# Altium footprint library MyComponents_v2.5.PcbLib: 403 footprints (part 13 of 26)
Each footprint in its own frame and in the unit in brackets; x right, y up, seen from the top. Pads: shape width x height; smd on the part's side, far side on the other; paste and mask are expansions set on the pad; w line width, h text height; cw(c..) or ccw(c..) is an arc to the next point about the centre after c.
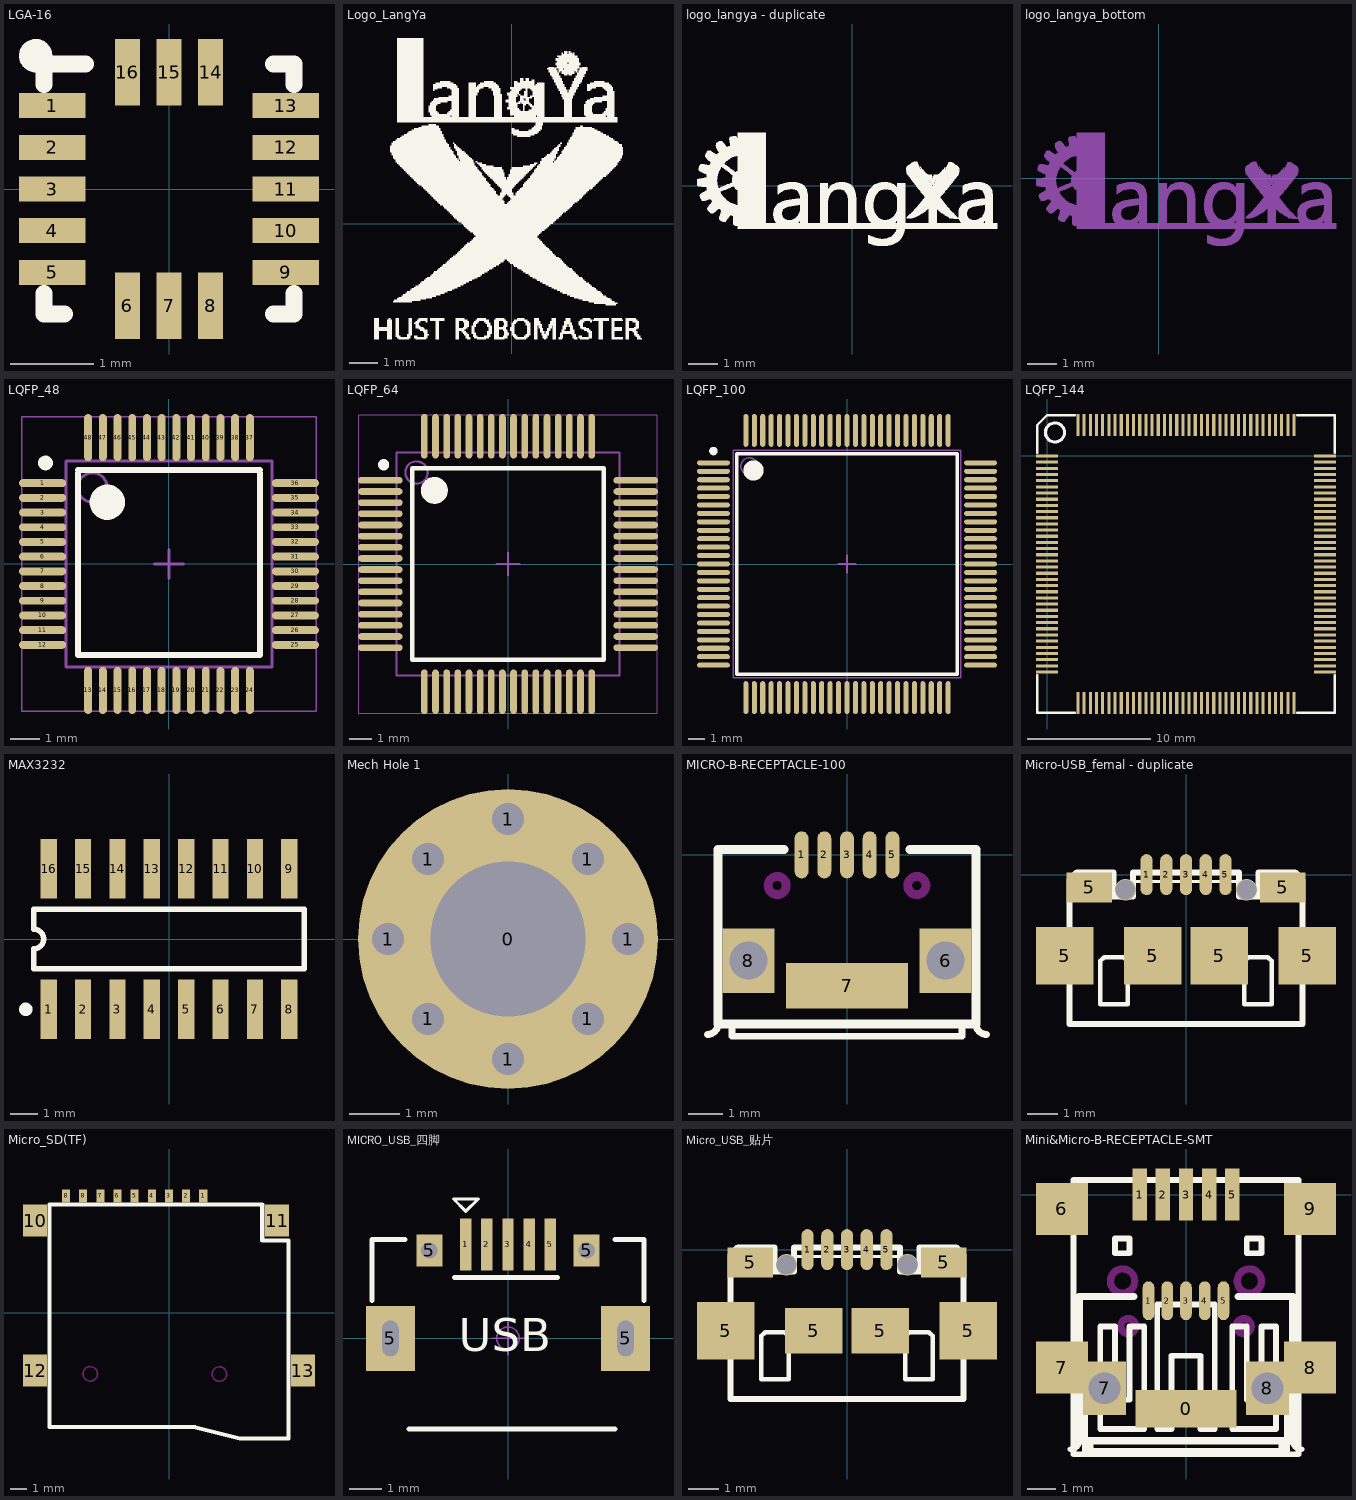
[diagram p12: the footprints below, top view; thin cyan lines are the x and y axes]

## LGA-16 [mm]
pads (16):
  rect 0.8x0.3 smd: 1(-1.4,1) 2(-1.4,0.5) 3(-1.4,0) 4(-1.4,-0.5) 5(-1.4,-1) 9(1.4,-1) 10(1.4,-0.5) 11(1.4,0) 12(1.4,0.5) 13(1.4,1)
  rect 0.3x0.8 smd: 6(-0.5,-1.4) 7(0,-1.4) 8(0.5,-1.4) 14(0.5,1.4) 15(0,1.4) 16(-0.5,1.4)
Top Overlay:
  circle w0.2: c-1.6,1.6 r0.1
  lines w0.2: -1.5,-1.25 -1.5,-1.5 ; -1.5,1.25 -1.5,1.5 -1,1.5 ; -1.25,-1.5 -1.5,-1.5 ; 1.25,-1.5 1.5,-1.5 ; 1.25,1.5 1.5,1.5 1.5,1.25 ; 1.5,-1.25 1.5,-1.5 ; -1.5,-1.5 -1.5,-1.5 ; 1.5,-1.5 1.5,-1.5
3D body "LGA16.step": height 1.01, standoff -0.01, extent -1.5,-1.5 1.5,1.5

## Logo_LangYa [mm]
Top Overlay:
  drawing of 953 lines, arcs and shapes, not listed

## logo_langya - duplicate [mm]
Top Overlay:
  drawing of 1377 lines, arcs and shapes, not listed

## logo_langya_bottom [mm]
Bottom Overlay:
  drawing of 1377 lines, arcs and shapes, not listed

## LQFP_48 [mm] "TSQFP, 48-Leads, Body 7.00x7.00mm, Pitch 0.50mm, IPC Medium Density"
height 1.6
pads (48):
  oval 1.6x0.27 smd: 1(-4.3,2.75) 2(-4.3,2.25) 3(-4.3,1.75) 4(-4.3,1.25) 5(-4.3,0.75) 6(-4.3,0.25) 7(-4.3,-0.25) 8(-4.3,-0.75) 9(-4.3,-1.25) 10(-4.3,-1.75) 11(-4.3,-2.25) 12(-4.3,-2.75) 25(4.3,-2.75) 26(4.3,-2.25) 27(4.3,-1.75) 28(4.3,-1.25) 29(4.3,-0.75) 30(4.3,-0.25) 31(4.3,0.25) 32(4.3,0.75) 33(4.3,1.25) 34(4.3,1.75) 35(4.3,2.25) 36(4.3,2.75)
  oval 0.27x1.6 smd: 13(-2.75,-4.3) 14(-2.25,-4.3) 15(-1.75,-4.3) 16(-1.25,-4.3) 17(-0.75,-4.3) 18(-0.25,-4.3) 19(0.25,-4.3) 20(0.75,-4.3) 21(1.25,-4.3) 22(1.75,-4.3) 23(2.25,-4.3) 24(2.75,-4.3) 37(2.75,4.3) 38(2.25,4.3) 39(1.75,4.3) 40(1.25,4.3) 41(0.75,4.3) 42(0.25,4.3) 43(-0.25,4.3) 44(-0.75,4.3) 45(-1.25,4.3) 46(-1.75,4.3) 47(-2.25,4.3) 48(-2.75,4.3)
Top Overlay:
  circle w0.25: c-4.2,3.435 r0.125
  circle w0.6: c-2.1,2.1 r0.3
  lines w0.2: -3.1,3.1 -3.1,-3.1 3.1,-3.1 3.1,3.1 ; -3.1,3.2 3.1,3.2
Mechanical 13:
  circle w0.1: c-2.6,2.6 r0.5
  lines w0.1: -3.5,-3.5 -3.5,3.5 3.5,3.5 3.5,-3.5 -3.5,-3.5
Mechanical 15:
  lines w0.05: -5,-5 -5,5 5,5 5,-5 -5,-5
  lines w0.1: -0.5,0 0.5,0 ; 0,-0.5 0,0.5
3D body "User Library-LQFP48.step": height 1.5, standoff 0, extent -4.5,-4.5 4.5,4.5

## LQFP_64 [mm]
pads (64):
  oval 2x0.3 smd: 1(-5.725,3.75) 2(-5.725,3.25) 3(-5.725,2.75) 4(-5.725,2.25) 5(-5.725,1.75) 6(-5.725,1.25) 7(-5.725,0.75) 8(-5.725,0.25) 9(-5.725,-0.25) 10(-5.725,-0.75) 11(-5.725,-1.25) 12(-5.725,-1.75) 13(-5.725,-2.25) 14(-5.725,-2.75) 15(-5.725,-3.25) 16(-5.725,-3.75) 33(5.725,-3.75) 34(5.725,-3.25) 35(5.725,-2.75) 36(5.725,-2.25) 37(5.725,-1.75) 38(5.725,-1.25) 39(5.725,-0.75) 40(5.725,-0.25) 41(5.725,0.25) 42(5.725,0.75) 43(5.725,1.25) 44(5.725,1.75) 45(5.725,2.25) 46(5.725,2.75) 47(5.725,3.25) 48(5.725,3.75)
  oval 0.3x2 smd: 17(-3.75,-5.725) 18(-3.25,-5.725) 19(-2.75,-5.725) 20(-2.25,-5.725) 21(-1.75,-5.725) 22(-1.25,-5.725) 23(-0.75,-5.725) 24(-0.25,-5.725) 25(0.25,-5.725) 26(0.75,-5.725) 27(1.25,-5.725) 28(1.75,-5.725) 29(2.25,-5.725) 30(2.75,-5.725) 31(3.25,-5.725) 32(3.75,-5.725) 49(3.75,5.725) 50(3.25,5.725) 51(2.75,5.725) 52(2.25,5.725) 53(1.75,5.725) 54(1.25,5.725) 55(0.75,5.725) 56(0.25,5.725) 57(-0.25,5.725) 58(-0.75,5.725) 59(-1.25,5.725) 60(-1.75,5.725) 61(-2.25,5.725) 62(-2.75,5.725) 63(-3.25,5.725) 64(-3.75,5.725)
Top Overlay:
  circle w0.25: c-5.575,4.45 r0.125
  circle w0.6: c-3.3,3.3 r0.3
  lines w0.2: -4.3,-4.3 -4.3,4.3 4.3,4.3 4.3,-4.3 -4.3,-4.3
Mechanical 13:
  circle w0.1: c-4.1,4.1 r0.5
  lines w0.1: -5,-5 -5,5 5,5 5,-5 -5,-5
Mechanical 15:
  lines w0.05: -6.7,-6.7 -6.7,6.7 6.7,6.7 6.7,-6.7 -6.7,-6.7
  lines w0.1: -0.5,0 0.5,0 ; 0,-0.5 0,0.5
3D body "LQFP64-2.STEP": height 1.62, standoff -0.01, extent -6.072,-6.072 6.072,6.072

## LQFP_100 [mm] "K60P100M-FINAL"
height 2.45
pads (100):
  oval 1.95x0.3 smd: 1(-7.925,6) 2(-7.925,5.5) 3(-7.925,5) 4(-7.925,4.5) 5(-7.925,4) 6(-7.925,3.5) 7(-7.925,3) 8(-7.925,2.5) 9(-7.925,2) 10(-7.925,1.5) 11(-7.925,1) 12(-7.925,0.5) 13(-7.925,0) 14(-7.925,-0.5) 15(-7.925,-1) 16(-7.925,-1.5) 17(-7.925,-2) 18(-7.925,-2.5) 19(-7.925,-3) 20(-7.925,-3.5) 21(-7.925,-4) 22(-7.925,-4.5) 23(-7.925,-5) 24(-7.925,-5.5) 25(-7.925,-6) 51(7.925,-6) 52(7.925,-5.5) 53(7.925,-5) 54(7.925,-4.5) 55(7.925,-4) 56(7.925,-3.5) 57(7.925,-3) 58(7.925,-2.5) 59(7.925,-2) 60(7.925,-1.5) 61(7.925,-1) 62(7.925,-0.5) 63(7.925,0) 64(7.925,0.5) 65(7.925,1) 66(7.925,1.5) 67(7.925,2) 68(7.925,2.5) 69(7.925,3) 70(7.925,3.5) 71(7.925,4) 72(7.925,4.5) 73(7.925,5) 74(7.925,5.5) 75(7.925,6)
  oval 0.3x1.95 smd: 26(-6,-7.925) 27(-5.5,-7.925) 28(-5,-7.925) 29(-4.5,-7.925) 30(-4,-7.925) 31(-3.5,-7.925) 32(-3,-7.925) 33(-2.5,-7.925) 34(-2,-7.925) 35(-1.5,-7.925) 36(-1,-7.925) 37(-0.5,-7.925) 38(0,-7.925) 39(0.5,-7.925) 40(1,-7.925) 41(1.5,-7.925) 42(2,-7.925) 43(2.5,-7.925) 44(3,-7.925) 45(3.5,-7.925) 46(4,-7.925) 47(4.5,-7.925) 48(5,-7.925) 49(5.5,-7.925) 50(6,-7.925) 76(6,7.925) 77(5.5,7.925) 78(5,7.925) 79(4.5,7.925) 80(4,7.925) 81(3.5,7.925) 82(3,7.925) 83(2.5,7.925) 84(2,7.925) 85(1.5,7.925) 86(1,7.925) 87(0.5,7.925) 88(0,7.925) 89(-0.5,7.925) 90(-1,7.925) 91(-1.5,7.925) 92(-2,7.925) 93(-2.5,7.925) 94(-3,7.925) 95(-3.5,7.925) 96(-4,7.925) 97(-4.5,7.925) 98(-5,7.925) 99(-5.5,7.925) 100(-6,7.925)
Top Overlay:
  circle w0.6: c-5.55,5.55 r0.3
  circle w0.25: c-7.925,6.7 r0.125
  lines w0.2: -6.55,-6.55 -6.55,0.711 -6.55,6.55 6.55,6.55 6.55,-6.55 -6.55,-6.55
Mechanical 13:
  circle w0.1: c-5.8,5.8 r0.5
  lines w0.1: -6.75,-6.75 6.75,-6.75 6.75,6.75 -6.75,6.75 -6.75,-6.75
Mechanical 15:
  lines w0.1: -0.5,0 0.5,0 ; 0,-0.5 0,0.5
3D body "User Library-LQFP100_Grid_0_5.STEP": height 1.6, standoff 0, extent -8.025,-8 7.975,8

## LQFP_144 [mm]
pads (144):
  rect 1.8x0.254 smd: 1(-0.009,0.001) 2(-0.009,-0.499) 3(-0.009,-0.999) 4(-0.009,-1.499) 5(-0.009,-1.999) 6(-0.009,-2.499) 7(-0.009,-2.999) 8(-0.009,-3.499) 9(-0.009,-3.999) 10(-0.009,-4.499) 11(-0.009,-4.999) 12(-0.009,-5.499) 13(-0.009,-5.999) 14(-0.009,-6.499) 15(-0.009,-6.999) 16(-0.009,-7.499) 17(-0.009,-7.999) 18(-0.009,-8.499) 19(-0.009,-8.999) 20(-0.009,-9.499) 21(-0.009,-9.999) 22(-0.009,-10.499) 23(-0.009,-10.999) 24(-0.009,-11.499) 25(-0.009,-11.999) 26(-0.009,-12.499) 27(-0.009,-12.999) 28(-0.009,-13.499) 29(-0.009,-13.999) 30(-0.009,-14.499) 31(-0.009,-14.999) 32(-0.009,-15.499) 33(-0.009,-15.999) 34(-0.009,-16.499) 35(-0.009,-16.999) 36(-0.009,-17.499) 73(22.491,-17.499) 74(22.491,-16.999) 75(22.491,-16.499) 76(22.491,-15.999) 77(22.491,-15.499) 78(22.491,-14.999) 79(22.491,-14.499) 80(22.491,-13.999) 81(22.491,-13.499) 82(22.491,-12.999) 83(22.491,-12.499) 84(22.491,-11.999) 85(22.491,-11.499) 86(22.491,-10.999) 87(22.491,-10.499) 88(22.491,-9.999) 89(22.491,-9.499) 90(22.491,-8.999) 91(22.491,-8.499) 92(22.491,-7.999) 93(22.491,-7.499) 94(22.491,-6.999) 95(22.491,-6.499) 96(22.491,-5.999) 97(22.491,-5.499) 98(22.491,-4.999) 99(22.491,-4.499) 100(22.491,-3.999) 101(22.491,-3.499) 102(22.491,-2.999) 103(22.491,-2.499) 104(22.491,-1.999) 105(22.491,-1.499) 106(22.491,-0.999) 107(22.491,-0.499) 108(22.491,0.001)
  rect 0.254x1.8 smd: 37(2.491,-19.999) 38(2.991,-19.999) 39(3.491,-19.999) 40(3.991,-19.999) 41(4.491,-19.999) 42(4.991,-19.999) 43(5.491,-19.999) 44(5.991,-19.999) 45(6.491,-19.999) 46(6.991,-19.999) 47(7.491,-19.999) 48(7.991,-19.999) 49(8.491,-19.999) 50(8.991,-19.999) 51(9.491,-19.999) 52(9.991,-19.999) 53(10.491,-19.999) 54(10.991,-19.999) 55(11.491,-19.999) 56(11.991,-19.999) 57(12.491,-19.999) 58(12.991,-19.999) 59(13.491,-19.999) 60(13.991,-19.999) 61(14.491,-19.999) 62(14.991,-19.999) 63(15.491,-19.999) 64(15.991,-19.999) 65(16.491,-19.999) 66(16.991,-19.999) 67(17.491,-19.999) 68(17.991,-19.999) 69(18.491,-19.999) 70(18.991,-19.999) 71(19.491,-19.999) 72(19.991,-19.999) 109(19.991,2.501) 110(19.491,2.501) 111(18.991,2.501) 112(18.491,2.501) 113(17.991,2.501) 114(17.491,2.501) 115(16.991,2.501) 116(16.491,2.501) 117(15.991,2.501) 118(15.491,2.501) 119(14.991,2.501) 120(14.491,2.501) 121(13.991,2.501) 122(13.491,2.501) 123(12.991,2.501) 124(12.491,2.501) 125(11.991,2.501) 126(11.491,2.501) 127(10.991,2.501) 128(10.491,2.501) 129(9.991,2.501) 130(9.491,2.501) 131(8.991,2.501) 132(8.491,2.501) 133(7.991,2.501) 134(7.491,2.501) 135(6.991,2.501) 136(6.491,2.501) 137(5.991,2.501) 138(5.491,2.501) 139(4.991,2.501) 140(4.491,2.501) 141(3.991,2.501) 142(3.491,2.501) 143(2.991,2.501) 144(2.491,2.501)
Top Overlay:
  circle w0.254: c0.624,1.905 r0.773
  lines w0.2: -0.809,-17.749 -0.809,-20.799 2.241,-20.799 ; -0.809,0.251 -0.809,2.501 -0.009,3.301 2.241,3.301 ; 20.241,-20.799 23.291,-20.799 23.291,-17.749 ; 20.241,3.301 23.291,3.301 23.291,0.251

## MAX3232 [mm]
pads (16):
  rect 0.6x2.2 smd: 1(-4.445,-2.6) 2(-3.175,-2.6) 3(-1.905,-2.6) 4(-0.635,-2.6) 5(0.635,-2.6) 6(1.905,-2.6) 7(3.175,-2.6) 8(4.445,-2.6) 9(4.445,2.6) 10(3.175,2.6) 11(1.905,2.6) 12(0.635,2.6) 13(-0.635,2.6) 14(-1.905,2.6) 15(-3.175,2.6) 16(-4.445,2.6)
Top Overlay:
  circle w0.25: c-5.295,-2.6 r0.125
  lines w0.2: -5,-1.1 5,-1.1 5,1.1 -5,1.1 -5,0.367 cw(c-5,0) -5,-0.367 -5,-1.1

## Mech Hole 1 [mm] "3.1mm"
pads (9):
  round 6 hole 3.1: 0(0,0)
  round 0.635 hole 0.635: 1(-2.4,0) 1(-1.6,-1.6) 1(-1.6,1.6) 1(0,-2.4) 1(0,2.4) 1(1.6,-1.6) 1(1.6,1.6) 1(2.4,0)
3D body "User Library-M3x0_5xL Phillips Panhead Screw.STEP": height 2.38, standoff -6, extent -2.8,-2.8 2.8,2.8

## MICRO-B-RECEPTACLE-100 [mm]
pads (8):
  oval 0.4x1.35 smd: 1(-1.3,0) 2(-0.65,0) 3(0,0) 4(0.65,0) 5(1.3,0)
  rect 1.5x1.85 hole 1.1: 6(2.825,-3.03) 8(-2.825,-3.03)
  rect 3.5x1.3 smd: 7(0,-3.75)
Top Overlay:
  lines w0.2: -4,-5.15 ccw(c-4,-4.85) -3.7,-4.85 ; -3.3,-4.85 -3.3,-5.2 3.3,-5.2 3.3,-4.85 ; 3.7,-4.85 ccw(c4,-4.85) 4,-5.15
  lines w0.254: -1.8,0.15 -3.7,0.15 -3.7,-4.85 3.7,-4.85 3.7,0.15 1.8,0.15
Bottom Overlay:
  lines w0.254: -4.1,-4.65 4.1,-4.65 ; -4.1,-5.25 4.1,-5.25 4.1,0.15 -4.1,0.15 -4.1,-5.25
Keep-Out Layer:
  circle w0.254: c-2,-0.88 r0.26
  circle w0.254: c2,-0.88 r0.26

## Micro-USB_femal - duplicate [mm]
pads (11):
  oval 0.4x1.35 smd: 1(-1.3,0) 2(-0.65,0) 3(0,0) 4(0.65,0) 5(1.3,0)
  rect 1.9x1.9 smd: 5(-4,-2.675) 5(-1.1,-2.675) 5(1.1,-2.675) 5(4,-2.675)
  rect 1.5x1 smd: 5(-3.2,-0.425) 5(3.2,-0.425)
via -2,-0.5 diameter 0.7 hole 0.65
via 2,-0.5 diameter 0.7 hole 0.65
Top Overlay:
  lines w0.1: -1.75,-0.225 1.75,-0.225
  lines w0.15: -2.825,-4.275 -1.925,-4.275 -1.925,-2.85 -2.05,-2.725 -2.7,-2.725 -2.825,-2.85 -2.825,-4.275 ; 1.925,-4.275 1.925,-2.85 2.05,-2.725 2.7,-2.725 2.825,-2.85 2.825,-4.275 1.925,-4.275
  lines w0.2: -3.85,-4.925 3.85,-4.925 3.85,-0.175 3.6,0.075 2.4,0.075 2.4,-0.725 1.75,-0.725 1.75,0.075 -1.75,0.075 -1.75,-0.725 -2.4,-0.725 -2.4,0.075 -3.6,0.075 -3.85,-0.175 -3.85,-4.925
3D body "microUSB.stp": height 2.71, standoff -0.23, extent -4.4,-5.381 4.4,0.35

## Micro_SD(TF) [mm] "TF Card"
height 0.6
pads (13):
  rect 0.5x0.8 smd: 1(2.108,7.236) 2(1.046,7.236) 3(-0.017,7.236) 4(-1.079,7.236) 5(-2.142,7.236) 6(-3.204,7.236) 7(-4.267,7.236) 8(-6.392,7.236) 8(-5.329,7.236)
  rect 1.5x2 smd: 10(-8.306,5.712) 11(6.68,5.712) 12(-8.306,-3.583) 13(8.28,-3.583)
Top Overlay:
  lines w0.254: 1.524,-7.083 4.368,-7.794 ; 1.591,-7.091 -7.409,-7.091 -7.409,6.709 5.765,6.709 5.765,4.468 7.391,4.468 7.391,-7.791 4.391,-7.791
Keep-Out Layer:
  circle w0.1: c-4.892,-3.787 r0.45
  circle w0.1: c3.108,-3.801 r0.45

## MICRO_USB_四脚 [mm] "micro型USB ，5.7*7.8*2.5mm"
pads (9):
  rect 0.35x1.6 smd: 1(-1.3,2.9) 2(-0.65,2.9) 3(0,2.9) 4(0.65,2.9) 5(1.3,2.9)
  rect 1.5x2 hole 0.5 slot 1.1 at 90 deg: 5(-3.625,0) 5(3.625,0)
  rect 0.8x1 hole 0.5: 5(-2.425,2.71) 5(2.425,2.71)
Top Overlay:
  lines w0.1: -1.681,4.297 -1.3,3.916 -0.919,4.297 -1.681,4.297
  lines w0.152: -4.191,1.168 -4.191,3.048 -3.175,3.048 ; -3.048,-2.794 3.302,-2.794 ; -1.65,1.875 1.525,1.875 ; 3.302,3.048 4.191,3.048 4.191,1.168
  text "USB" at -1.524,-0.402 h1.02
Mechanical 15:
  circle w0.05: c0,0 r0.35
  lines w0.05: -0.5,0 0.5,0 ; 0,-0.5 0,0.5
3D body "USB micro_A.STEP": height 2.8, standoff -0.95, extent -4.001,-2.71 4.001,2.89

## Micro_USB_贴片 [mm]
pads (11):
  oval 0.4x1.35 smd: 1(-1.3,0) 2(-0.65,0) 3(0,0) 4(0.65,0) 5(1.3,0)
  rect 1.9x1.9 smd: 5(-4,-2.675) 5(4,-2.675)
  rect 1.5x1 smd: 5(-3.2,-0.425) 5(3.2,-0.425)
  rect 1.9x1.5 smd: 5(-1.1,-2.675) 5(1.1,-2.675)
via -2,-0.5 diameter 0.7 hole 0.65
via 2,-0.5 diameter 0.7 hole 0.65
Top Overlay:
  lines w0.1: -1.75,-0.225 1.75,-0.225
  lines w0.15: -2.825,-4.275 -1.925,-4.275 -1.925,-2.85 -2.05,-2.725 -2.7,-2.725 -2.825,-2.85 -2.825,-4.275 ; 1.925,-4.275 1.925,-2.85 2.05,-2.725 2.7,-2.725 2.825,-2.85 2.825,-4.275 1.925,-4.275
  lines w0.2: -3.85,-4.925 3.85,-4.925 3.85,-0.175 3.6,0.075 2.4,0.075 2.4,-0.725 1.75,-0.725 1.75,0.075 -1.75,0.075 -1.75,-0.725 -2.4,-0.725 -2.4,0.075 -3.6,0.075 -3.85,-0.175 -3.85,-4.925
3D body "microUSB.stp": height 2.71, standoff -0.23, extent -4.4,-5.381 4.4,0.35

## Mini&Micro-B-RECEPTACLE-SMT [mm] "MINI&MICRO"
pads (17):
  rect 3.5x1.3 smd: 0(0,-7.433)
  rect 0.5x1.8 smd: 1(-1.6,0) 2(-0.8,0) 3(0,0) 4(0.8,0) 5(1.6,0)
  oval 0.4x1.35 smd: 1(-1.3,-3.683) 2(-0.65,-3.683) 3(0,-3.683) 4(0.65,-3.683) 5(1.3,-3.683)
  rect 1.8x1.8 smd: 6(-4.3,-0.5) 7(-4.3,-6) 8(4.3,-6) 9(4.3,-0.5)
  rect 1.5x1.85 hole 1.1: 7(-2.825,-6.713) 8(2.825,-6.713)
Top Overlay:
  lines w0.2: -4,-8.833 ccw(c-4,-8.533) -3.7,-8.533 ; -3.9,-7.112 -3.5,-7.112 -3.5,-9 ; -3.3,-8.533 -3.3,-8.883 3.3,-8.883 3.3,-8.533 ; 3.5,-9 3.5,-7.112 3.9,-7.112 ; 3.7,-8.533 ccw(c4,-8.533) 4,-8.833 ; -3.9,-9 3.9,-9 3.9,0.5 -3.9,0.5 -3.9,-9 ; -2.972,-8.128 -2.972,-4.572 -2.464,-4.572 -2.464,-7.112 -1.956,-7.112 -1.956,-4.572 -1.448,-4.572 -1.448,-8.128 -2.972,-8.128 ; -2.464,-2.032 -1.956,-2.032 -1.956,-1.524 -2.464,-1.524 -2.464,-2.032 ; -1,-8.128 -0.5,-8.128 -0.5,-5.588 0.5,-5.588 0.5,-8.128 1,-8.128 1,-3.81 -1,-3.81 -1,-8.128 ; 1.6,-8.128 1.6,-4.572 2.108,-4.572 2.108,-7.112 2.616,-7.112 2.616,-4.572 3.124,-4.572 3.124,-8.128 1.6,-8.128 ; 2.108,-2.032 2.616,-2.032 2.616,-1.524 2.108,-1.524 2.108,-2.032
  lines w0.254: -1.8,-3.533 -3.7,-3.533 -3.7,-8.533 3.7,-8.533 3.7,-3.533 1.8,-3.533
Bottom Overlay:
  lines w0.2: -3.9,-7.112 -3.5,-7.112 -3.5,-9 ; 3.5,-9 3.5,-7.112 3.9,-7.112 ; -3.9,-9 -3.9,0.5 3.9,0.5 3.9,-9 -3.9,-9
  lines w0.254: -4.1,-8.333 4.1,-8.333 ; -4.1,-8.933 -4.1,-3.533 4.1,-3.533 4.1,-8.933 -4.1,-8.933
Keep-Out Layer:
  circle w0.254: c-2.2,-3 r0.42
  circle w0.254: c2.2,-3 r0.42
  circle w0.254: c2,-4.563 r0.26
  circle w0.254: c-2,-4.563 r0.26
3D body "usb_a-usb_b-m5-smd-c.stp": height 3.93, standoff -1, extent -5.065,-8.615 4.835,0.635